# Altium footprint library 430 integreted.PcbLib: 281 footprints (part 3 of 18)
Each footprint in its own frame and in the unit in brackets; x right, y up, seen from the top. Pads: shape width x height; smd on the part's side, far side on the other; paste and mask are expansions set on the pad; w line width, h text height; cw(c..) or ccw(c..) is an arc to the next point about the centre after c.
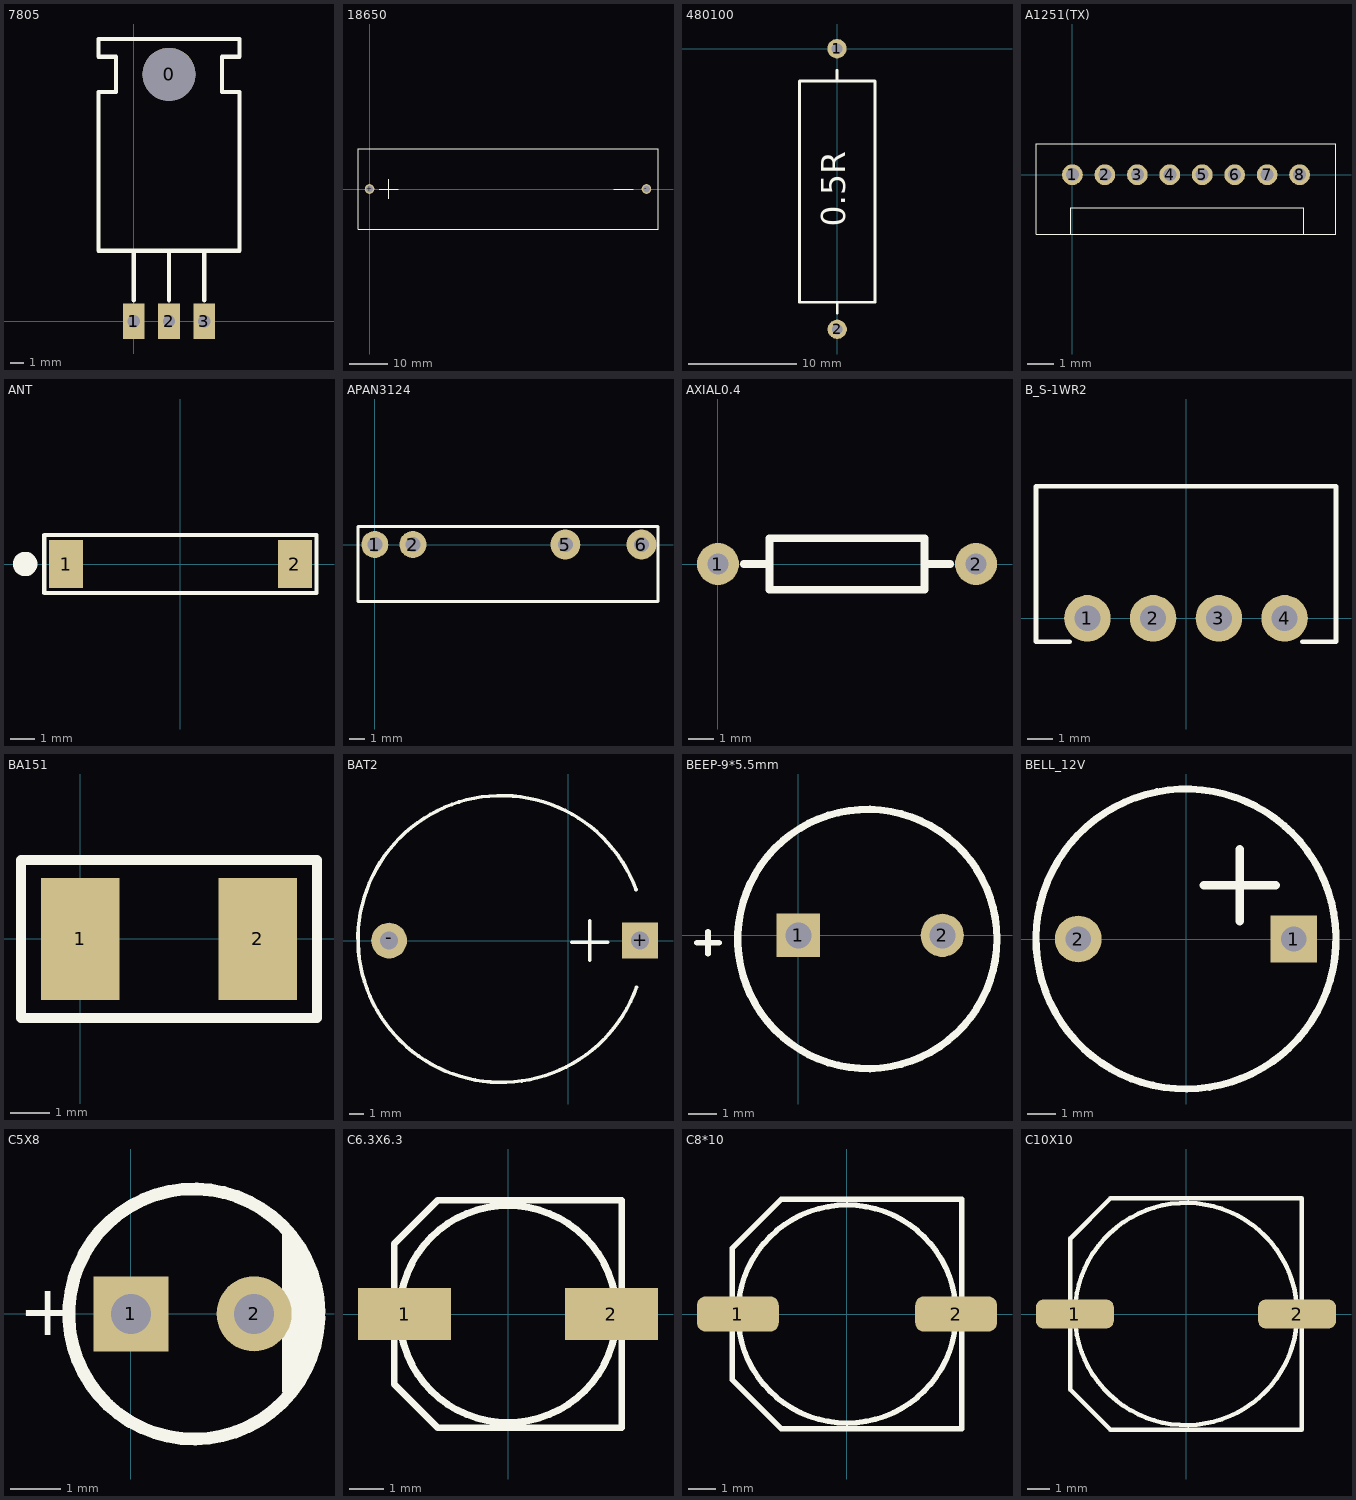
[diagram p2: the footprints below, top view; thin cyan lines are the x and y axes]

## 7805 [mil]
pads (4):
  round 150 hole 150: 0(100,700)
  rect 62x100 hole 35: 1(0,0) 2(100,0) 3(200,0)
Top Overlay:
  lines w12: 0,60 0,200 ; 100,60 100,200 ; 200,60 200,200 ; -100,200 -100,650 -50,650 -50,750 -100,750 -100,800 300,800 300,750 250,750 250,650 300,650 300,200 -100,200

## 18650 [mm]
pads (2):
  round 2.5 hole 1.8: +(0,0) -(72,0)
Top Overlay:
  lines w0.178: 63.5,0 68.5,0 ; -3,-10.5 -3,10.5 75,10.5 75,-10.5 -3,-10.5
  lines w0.254: 2.5,0 7.5,0 ; 5,-2.5 5,2.5

## 480100 [mm]
pads (2):
  round 1.8 hole 1: 1(-0.025,0.009) 2(0,-26)
Top Overlay:
  lines w0.254: -0.025,-2.991 -0.025,-1.991 ; 0,-24.5 0,-23.5 ; -3.5,-23.5 -3.5,-2.991 3.5,-2.991 3.5,-23.5 -3.5,-23.5
  text "0.5R" at 1.5,-16.5 h3.81

## A1251(TX) [mm]
pads (8):
  round 0.8 hole 0.5: 1(0,0) 2(1.25,0) 3(2.5,0) 4(3.75,0) 5(5,0) 6(6.25,0) 7(7.5,0) 8(8.75,0)
Top Overlay:
  lines w0.025: -0.06,-2.3 -0.06,-1.27 6.29,-1.27 8.9,-1.27 8.9,-2.3 ; -1.4,-2.3 -1.4,1.2 10.15,1.2 10.15,-2.3 -1.4,-2.3

## ANT [mm]
pads (2):
  rect 1.4x2 smd: 1(-4.75,0) 2(4.75,0)
Top Overlay:
  circle w0.508: c-6.45,0 r0.254
  lines w0.178: -5.65,-1.2 -5.65,1.2 5.65,1.2 5.65,-1.2 -5.65,-1.2
3D body: height 1, standoff -0.02, extent -4.642,-1.041 4.858,1.059

## APAN3124 [mm]
pads (4):
  round 1.8 hole 1: 1(0,0) 2(2.54,0)
  round 2 hole 1: 5(12.7,0) 6(17.78,0)
Top Overlay:
  lines w0.178: -1.12,-3.8 -1.12,1.2 18.88,1.2 18.88,-3.8 -1.12,-3.8

## AXIAL0.4 [mil]
pads (2):
  round 65 hole 32: 1(0,0) 2(400,0)
Top Overlay:
  lines w12: 40,0 80,0 ; 320,0 360,0 ; 80,-40 80,40 320,40 320,-40 80,-40

## B_S-1WR2 [mm]
pads (4):
  round 1.8 hole 1: 1(-3.81,0) 2(-1.27,0) 3(1.27,0) 4(3.81,0)
Top Overlay:
  lines w0.178: -4.5,-0.9 -5.8,-0.9 -5.8,5.1 5.8,5.1 5.8,-0.9 4.5,-0.9

## BA151 [mm]
pads (2):
  rect 2x3.105 smd: 1(0,0) 2(4.5,0)
Top Overlay:
  lines w0.254: -1.5,-2 -1.5,2 6,2 6,-2 -1.5,-2

## BAT2 [mm]
pads (2):
  rect 2.54x2.54 hole 1.27: +(5.08,0)
  round 2.54 hole 1.27: -(-12.7,0)
Top Overlay:
  lines w0.254: 0.243,-0.127 2.783,-0.127 ; 1.513,-1.397 1.513,1.397 ; 4.794,3.621 ccw(c-4.742,0.115) 4.826,-3.302

## BEEP-9*5.5mm [mm]
pads (2):
  rect 1.5x1.5 hole 0.9: 1(0,0)
  round 1.5 hole 0.9: 2(5,0)
Top Overlay:
  circle w0.254: c2.398,-0.127 r4.5
  lines w0.2: -3.516,-0.254 -2.754,-0.254 ; -3.135,-0.635 -3.135,0.127

## BELL_12V [mil]
pads (2):
  rect 65x65 hole 35: 1(150,0)
  round 65 hole 35: 2(-150,0)
Top Overlay:
  lines w10: 208.75,4.97 cw(c0,0) 208.74,5.09
  lines w12: 25,75 125,75 ; 75,25 75,125

## C5X8 [mm]
pads (2):
  rect 1.5x1.5 hole 0.8: 1(0,0)
  round 1.5 hole 0.8: 2(2.462,0)
Top Overlay:
  lines w0.254: 3.758,-0.076 cw(c1.259,-0.004) 3.758,0.037
  lines w0.3: 3.173,-1.524 3.173,1.549
  lines w0.5: 3.427,-0.94 3.427,0.94
  text "+" at -2.237,-0.432 h1.02
3D body: height 8.13, standoff -2.37, extent -1.268,-2.503 3.732,2.489

## C6.3X6.3 [mm]
pads (2):
  rect 2.7x1.5 smd: 1(-3,0) 2(3,0)
Top Overlay:
  circle w0.2: c0,0 r3.15
  lines w0.2: -3.3,2.032 -3.3,-2.032 -2.032,-3.3 3.3,-3.3 3.3,3.3 -2.032,3.3 -3.287,2.045
3D body: height 5.2, standoff 0, extent -3.5,-3.302 3.5,3.298

## C8*10 [mm]
pads (2):
  rrect50% 3x1.3 smd: 1(-4,0) 2(4,0)
Top Overlay:
  circle w0.2: c0,0 r4
  lines w0.2: -4.2,-2.413 -2.413,-4.2 4.2,-4.2 4.2,4.2 -2.413,4.2 -4.2,2.413 -4.2,-2.413
3D body: height 10.5, standoff 0, extent -4.521,-4.216 4.479,4.084

## C10X10 [mm]
pads (2):
  rrect50% 3.5x1.3 smd: 1(-5,0) 2(5,0)
Top Overlay:
  circle w0.2: c0,0 r5
  lines w0.2: -5.2,3.404 -5.2,-3.404 -3.404,-5.2 5.2,-5.2 5.2,5.2 -3.404,5.2 -5.191,3.413
3D body: height 10.21, standoff -0.01, extent -5.775,-5.118 5.825,5.182